# Altium integrated library LEMO Unipole And Multipole Type Connectors.IntLib: 1566 symbols (part 10 of 13) (continued)
## PKC.M1.0GL.VV
designator J?
Fixed receptacle with two nuts (back panel mounting), 90° print contacts, Key (C),  series, Multipole Type with 10 Contacts; Manufacturer: LEMO; PartNumber: PKC.M1.0GL.VV; Number of contacts: 10; Contact Diameter: 0.5 mm; Test voltage (kV rms) Contact-Contact: 0.85; Rated Current(A): 3; DatasheetVersion: Jun-14; PackageReference: PKC.M1.0GL.VV; PackageDescription: Fixed receptacle with two nuts (back panel mounting), 90° print contacts, Key(C) for Printed Circuit; ComponentLink1Description: Manufacturer URL; ComponentLink1URL: http://www.lemo.com; ComponentLink2Description: Datasheet; ComponentLink2URL: http://intra.lemo.ch/catalog/ROW/UK_English/P_series_catalog.pdf
footprint PKC.M1.0GL.VV (Socket, Female, Height 33.5 mm, Through hole)
pins: 1, 2, 3, 4, 5, 6, 7, 8, 9, 10

## PKC.M1.0GL.VZ
designator J?
Fixed receptacle with 1 nut (without 2nd front nut), Key (C), P series, Multipole Type with 10 Contacts; Manufacturer: LEMO; PartNumber: PKC.M1.0GL.VZ; Number of contacts: 10; Contact Diameter: 0.5 mm; Test voltage (kV rms) Contact-Contact: 0.85; Rated Current(A): 3; DatasheetVersion: Jun-14; PackageReference: PKC.M1.0GL.VZ; PackageDescription: Fixed receptacle with 1 nut (without 2nd front nut), Key(C) for Printed Circuit; ComponentLink1Description: Manufacturer URL; ComponentLink1URL: http://www.lemo.com; ComponentLink2Description: Datasheet; ComponentLink2URL: http://intra.lemo.ch/catalog/ROW/UK_English/P_series_catalog.pdf
footprint PKC.M1.0GL.VZ (Socket, Female, Height 33.5 mm, Through hole)
pins: 1, 2, 3, 4, 5, 6, 7, 8, 9, 10

## PKC.M1.0NL.NZ
designator J?
Fixed receptacle with 1 nut (without 2nd front nut), Key (C), P series, Multipole Type with 10 Contacts; Manufacturer: LEMO; PartNumber: PKC.M1.0NL.NZ; Number of contacts: 10; Contact Diameter: 0.5 mm; Test voltage (kV rms) Contact-Contact: 0.85; Rated Current(A): 3; DatasheetVersion: Jun-14; PackageReference: PKC.M1.0NL.NZ; PackageDescription: Fixed receptacle with 1 nut (without 2nd front nut), Key(C) for Printed Circuit; ComponentLink1Description: Manufacturer URL; ComponentLink1URL: http://www.lemo.com; ComponentLink2Description: Datasheet; ComponentLink2URL: http://intra.lemo.ch/catalog/ROW/UK_English/P_series_catalog.pdf
footprint PKC.M1.0NL.NZ (Socket, Female, Height 25 mm, Through hole)
pins: 1, 2, 3, 4, 5, 6, 7, 8, 9, 10

## PKC.M1.0NL.VN
designator J?
Fixed receptacle with two nuts (back panel mounting), 90° print contacts, Key (C), P series, Multipole Type with 10 Contacts; Manufacturer: LEMO; PartNumber: PKC.M1.0NL.VN; Number of contacts: 10; Contact Diameter: 0.5 mm; Test voltage (kV rms) Contact-Contact: 0.85; Rated Current(A): 3; DatasheetVersion: Jun-14; PackageReference: PKC.M1.0NL.VN; PackageDescription: Fixed receptacle with two nuts (back panel mounting), 90° print contacts, Key(C) for Printed Circuit; ComponentLink1Description: Manufacturer URL; ComponentLink1URL: http://www.lemo.com; ComponentLink2Description: Datasheet; ComponentLink2URL: http://intra.lemo.ch/catalog/ROW/UK_English/P_series_catalog.pdf
footprint PKC.M1.0NL.VN (Socket, Female, Height 33.5 mm, Through hole)
pins: 1, 2, 3, 4, 5, 6, 7, 8, 9, 10

## PKC.M1.0SL.NG
designator J?
Fixed receptacle with two nuts (back panel mounting), straight print contacts, Key (C), P series, Multipole Type with 10 Contacts; Manufacturer: LEMO; PartNumber: PKC.M1.0SL.NG; Number of contacts: 10; Contact Diameter: 0.5 mm; Test voltage (kV rms) Contact-Contact: 0.85; Rated Current(A): 3; DatasheetVersion: Jun-14; PackageReference: PKC.M1.0SL.NG; PackageDescription: Fixed receptacle with two nuts (back panel mounting), straight print contacts, Key(C) for Printed Circuit; Supplier 1: Mouser; Supplier Part Number 1: 736-PKC.M1.0SL.NG; Supplier 2: Digi-Key; Supplier Part Number 2: PKC.M1.0SL.NG-ND; ComponentLink1Description: Manufacturer URL; ComponentLink1URL: http://www.lemo.com; ComponentLink2Description: Datasheet; ComponentLink2URL: http://intra.lemo.ch/catalog/ROW/UK_English/P_series_catalog.pdf
footprint PKC.M1.0SL.NG (Socket, Female, Height 33.5 mm, Through hole)
pins: 1, 2, 3, 4, 5, 6, 7, 8, 9, 10

## PKC.M1.0SL.NJ
designator J?
Fixed receptacle with two nuts (back panel mounting), straight print contacts, Key (C), P series, Multipole Type with 10 Contacts; Manufacturer: LEMO; PartNumber: PKC.M1.0SL.NJ; Number of contacts: 10; Contact Diameter: 0.5 mm; Test voltage (kV rms) Contact-Contact: 0.85; Rated Current(A): 3; DatasheetVersion: Jun-14; PackageReference: PKC.M1.0SL.NJ; PackageDescription: Fixed receptacle with two nuts (back panel mounting), straight print contacts, Key(C) for Printed Circuit; Supplier 1: Mouser; Supplier Part Number 1: 736-PKCM10SLNJ; Supplier 2: Digi-Key; Supplier Part Number 2: PKC.M1.0SL.NJ-ND; ComponentLink1Description: Manufacturer URL; ComponentLink1URL: http://www.lemo.com; ComponentLink2Description: Datasheet; ComponentLink2URL: http://intra.lemo.ch/catalog/ROW/UK_English/P_series_catalog.pdf
footprint PKC.M1.0SL.NJ (Socket, Female, Height 33.5 mm, Through hole)
pins: 1, 2, 3, 4, 5, 6, 7, 8, 9, 10

## PKC.M1.0SL.VG
designator J?
Fixed receptacle with two nuts (back panel mounting), 90° print contacts, Key (C), P series, Multipole Type with 10 Contacts; Manufacturer: LEMO; PartNumber: PKC.M1.0SL.VG; Number of contacts: 10; Contact Diameter: 0.5 mm; Test voltage (kV rms) Contact-Contact: 0.85; Rated Current(A): 3; DatasheetVersion: Jun-14; PackageReference: PKC.M1.0SL.VG; PackageDescription: Fixed receptacle with two nuts (back panel mounting), 90° print contacts, Key(C) for Printed Circuit; Supplier 1: Mouser; Supplier Part Number 1: 736-PKCM10SLVG; Supplier 2: Digi-Key; Supplier Part Number 2: PKC.M1.0SL.VG-ND; ComponentLink1Description: Manufacturer URL; ComponentLink1URL: http://www.lemo.com; ComponentLink2Description: Datasheet; ComponentLink2URL: http://intra.lemo.ch/catalog/ROW/UK_English/P_series_catalog.pdf
footprint PKC.M1.0SL.VG (Socket, Female, Height 33.5 mm, Through hole)
pins: 1, 2, 3, 4, 5, 6, 7, 8, 9, 10

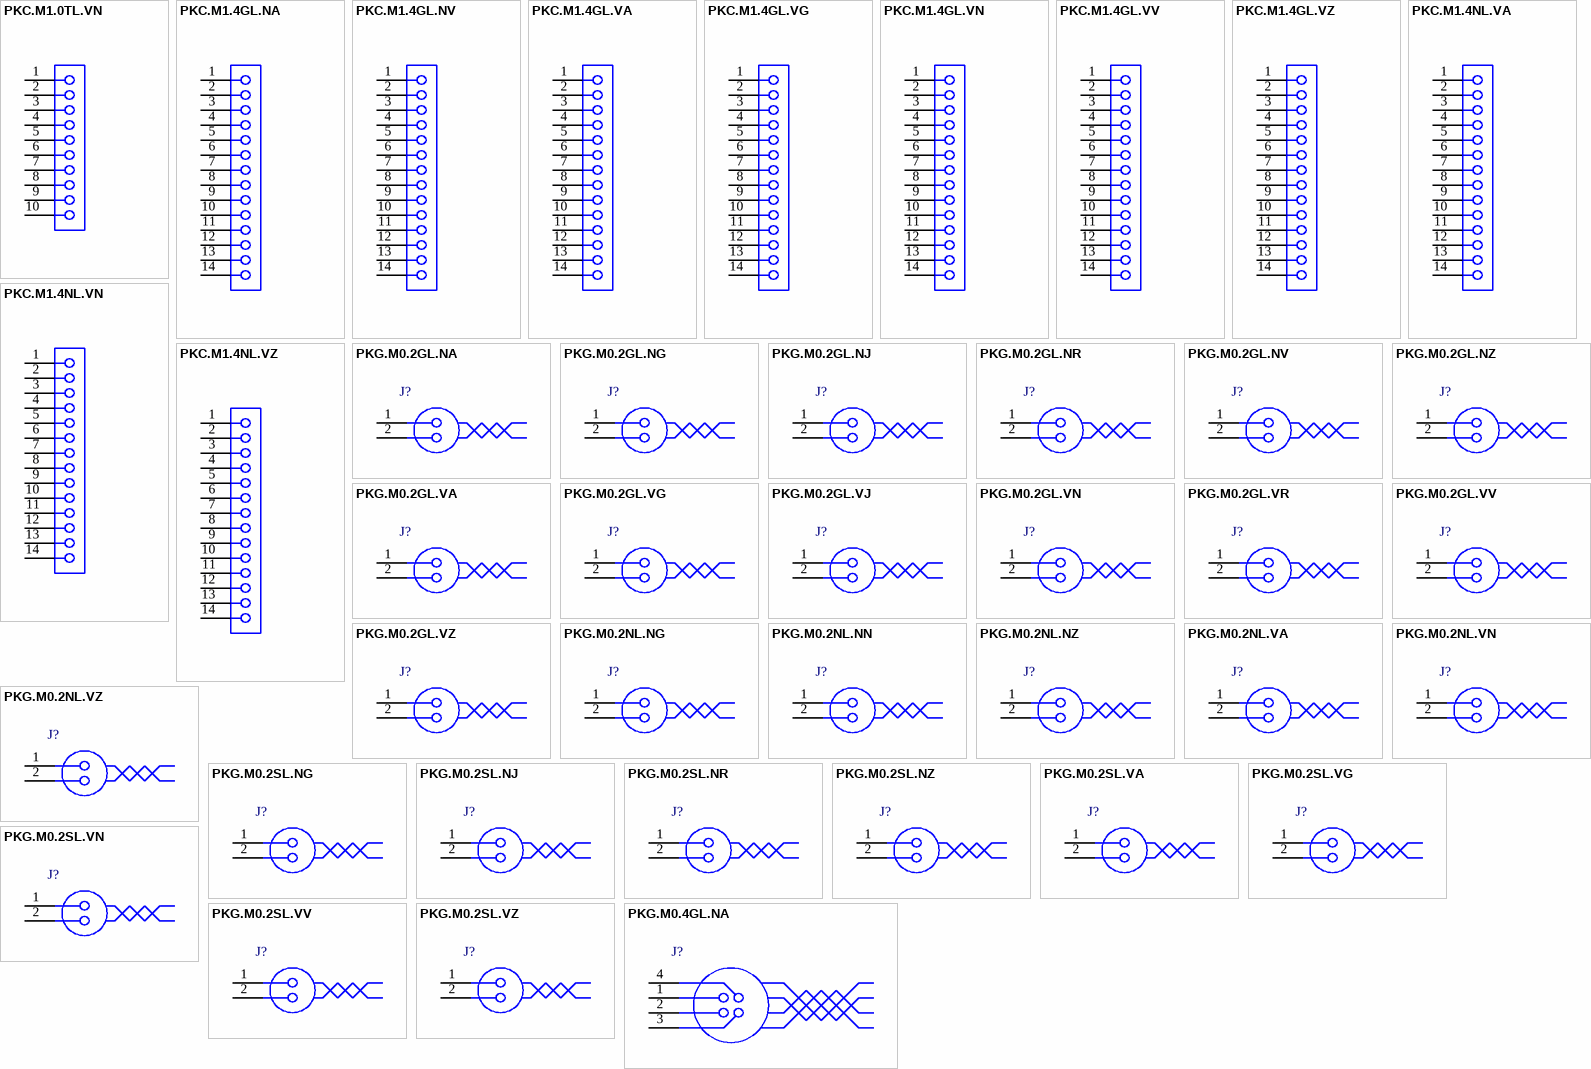
[diagram p33: symbols PKC.M1.0TL.VN to PKG.M0.4GL.NA]

## PKC.M1.0TL.VN
designator J?
Fixed receptacle with two nuts (back panel mounting), 90° print contacts, Key (C), P series, Multipole Type with 10 Contacts; Manufacturer: LEMO; PartNumber: PKC.M1.0TL.VN; Number of contacts: 10; Contact Diameter: 0.5 mm; Test voltage (kV rms) Contact-Contact: 0.85; Rated Current(A): 3; DatasheetVersion: Jun-14; PackageReference: PKC.M1.0TL.VN; PackageDescription: Fixed receptacle with two nuts (back panel mounting), 90° print contacts, Key(C) for Printed Circuit; ComponentLink1Description: Manufacturer URL; ComponentLink1URL: http://www.lemo.com; ComponentLink2Description: Datasheet; ComponentLink2URL: http://intra.lemo.ch/catalog/ROW/UK_English/P_series_catalog.pdf
footprint PKC.M1.0TL.VN (Socket, Female, Height 33.5 mm, Through hole)
pins: 1, 2, 3, 4, 5, 6, 7, 8, 9, 10

## PKC.M1.4GL.NA
designator J?
Fixed receptacle with two nuts (back panel mounting), straight print contacts, Key (C), P series, Multipole Type with 14 Contacts; Manufacturer: LEMO; PartNumber: PKC.M1.4GL.NA; Number of contacts: 14; Contact Diameter: 0.5 mm; Test voltage (kV rms) Contact-Contact: 0.6; Rated Current(A): 2; DatasheetVersion: Jun-14; PackageReference: PKC.M1.4GL.NA; PackageDescription: Fixed receptacle with two nuts (back panel mounting), straight print contacts, Key(C) for Printed Circuit; ComponentLink1Description: Manufacturer URL; ComponentLink1URL: http://www.lemo.com; ComponentLink2Description: Datasheet; ComponentLink2URL: http://intra.lemo.ch/catalog/ROW/UK_English/P_series_catalog.pdf
footprint PKC.M1.4GL.NA (Socket, Female, Height 33.5 mm, Through hole)
pins: 1, 2, 3, 4, 5, 6, 7, 8, 9, 10, 11, 12, 13, 14

## PKC.M1.4GL.NV
designator J?
Fixed receptacle with two nuts (back panel mounting), straight print contacts, Key (C), P series, Multipole Type with 14 Contacts; Manufacturer: LEMO; PartNumber: PKC.M1.4GL.NV; Number of contacts: 14; Contact Diameter: 0.5 mm; Test voltage (kV rms) Contact-Contact: 0.6; Rated Current(A): 2; DatasheetVersion: Jun-14; PackageReference: PKC.M1.4GL.NV; PackageDescription: Fixed receptacle with two nuts (back panel mounting), straight print contacts, Key(C) for Printed Circuit; ComponentLink1Description: Manufacturer URL; ComponentLink1URL: http://www.lemo.com; ComponentLink2Description: Datasheet; ComponentLink2URL: http://intra.lemo.ch/catalog/ROW/UK_English/P_series_catalog.pdf
footprint PKC.M1.4GL.NV (Socket, Female, Height 33.5 mm, Through hole)
pins: 1, 2, 3, 4, 5, 6, 7, 8, 9, 10, 11, 12, 13, 14

## PKC.M1.4GL.VA
designator J?
Fixed receptacle with two nuts (back panel mounting), 90° print contacts, Key (C), P series, Multipole Type with 14 Contacts; Manufacturer: LEMO; PartNumber: PKC.M1.4GL.VA; Number of contacts: 14; Contact Diameter: 0.5 mm; Test voltage (kV rms) Contact-Contact: 0.6; Rated Current(A): 2; DatasheetVersion: Jun-14; PackageReference: PKC.M1.4GL.VA; PackageDescription: Fixed receptacle with two nuts (back panel mounting), 90° print contacts, Key(C) for Printed Circuit; ComponentLink1Description: Manufacturer URL; ComponentLink1URL: http://www.lemo.com; ComponentLink2Description: Datasheet; ComponentLink2URL: http://intra.lemo.ch/catalog/ROW/UK_English/P_series_catalog.pdf
footprint PKC.M1.4GL.VA (Socket, Female, Height 33.5 mm, Through hole)
pins: 1, 2, 3, 4, 5, 6, 7, 8, 9, 10, 11, 12, 13, 14

## PKC.M1.4GL.VG
designator J?
Fixed receptacle with two nuts (back panel mounting), 90° print contacts, Key (C),  series, Multipole Type with 14 Contacts; Manufacturer: LEMO; PartNumber: PKC.M1.4GL.VG; Number of contacts: 14; Contact Diameter: 0.5 mm; Test voltage (kV rms) Contact-Contact: 0.6; Rated Current(A): 2; DatasheetVersion: Jun-14; PackageReference: PKC.M1.4GL.VG; PackageDescription: Fixed receptacle with two nuts (back panel mounting), 90° print contacts, Key(C) for Printed Circuit; ComponentLink1Description: Manufacturer URL; ComponentLink1URL: http://www.lemo.com; ComponentLink2Description: Datasheet; ComponentLink2URL: http://intra.lemo.ch/catalog/ROW/UK_English/P_series_catalog.pdf
footprint PKC.M1.4GL.VG (Socket, Female, Height 33.5 mm, Through hole)
pins: 1, 2, 3, 4, 5, 6, 7, 8, 9, 10, 11, 12, 13, 14

## PKC.M1.4GL.VN
designator J?
Fixed receptacle with two nuts (back panel mounting), 90° print contacts, Key (C), P series, Multipole Type with 14 Contacts; Manufacturer: LEMO; PartNumber: PKC.M1.4GL.VN; Number of contacts: 14; Contact Diameter: 0.5 mm; Test voltage (kV rms) Contact-Contact: 0.6; Rated Current(A): 2; DatasheetVersion: Jun-14; PackageReference: PKC.M1.4GL.VN; PackageDescription: Fixed receptacle with two nuts (back panel mounting), 90° print contacts, Key(C) for Printed Circuit; ComponentLink1Description: Manufacturer URL; ComponentLink1URL: http://www.lemo.com; ComponentLink2Description: Datasheet; ComponentLink2URL: http://intra.lemo.ch/catalog/ROW/UK_English/P_series_catalog.pdf
footprint PKC.M1.4GL.VN (Socket, Female, Height 33.5 mm, Through hole)
pins: 1, 2, 3, 4, 5, 6, 7, 8, 9, 10, 11, 12, 13, 14

## PKC.M1.4GL.VV
designator J?
Fixed receptacle with two nuts (back panel mounting), 90° print contacts, Key (C), P series, Multipole Type with 14 Contacts; Manufacturer: LEMO; PartNumber: PKC.M1.4GL.VV; Number of contacts: 14; Contact Diameter: 0.5 mm; Test voltage (kV rms) Contact-Contact: 0.6; Rated Current(A): 2; DatasheetVersion: Jun-14; PackageReference: PKC.M1.4GL.VV; PackageDescription: Fixed receptacle with two nuts (back panel mounting), 90° print contacts, Key(C) for Printed Circuit; ComponentLink1Description: Manufacturer URL; ComponentLink1URL: http://www.lemo.com; ComponentLink2Description: Datasheet; ComponentLink2URL: http://intra.lemo.ch/catalog/ROW/UK_English/P_series_catalog.pdf
footprint PKC.M1.4GL.VV (Socket, Female, Height 33.5 mm, Through hole)
pins: 1, 2, 3, 4, 5, 6, 7, 8, 9, 10, 11, 12, 13, 14

## PKC.M1.4GL.VZ
designator J?
Fixed receptacle with 1 nut (without 2nd front nut), Key (C), P series, Multipole Type with 14 Contacts; Manufacturer: LEMO; PartNumber: PKC.M1.4GL.VZ; Number of contacts: 14; Contact Diameter: 0.5 mm; Test voltage (kV rms) Contact-Contact: 0.6; Rated Current(A): 2; DatasheetVersion: Jun-14; PackageReference: PKC.M1.4GL.VZ; PackageDescription: Fixed receptacle with 1 nut (without 2nd front nut), Key(C) for Printed Circuit; ComponentLink1Description: Manufacturer URL; ComponentLink1URL: http://www.lemo.com; ComponentLink2Description: Datasheet; ComponentLink2URL: http://intra.lemo.ch/catalog/ROW/UK_English/P_series_catalog.pdf
footprint PKC.M1.4GL.VZ (Socket, Female, Height 33.5 mm, Through hole)
pins: 1, 2, 3, 4, 5, 6, 7, 8, 9, 10, 11, 12, 13, 14

## PKC.M1.4NL.VA
designator J?
Fixed receptacle with two nuts (back panel mounting), 90° print contacts, Key (C),  series, Multipole Type with 14 Contacts; Manufacturer: LEMO; PartNumber: PKC.M1.4NL.VA; Number of contacts: 14; Contact Diameter: 0.5 mm; Test voltage (kV rms) Contact-Contact: 0.6; Rated Current(A): 2; DatasheetVersion: Jun-14; PackageReference: PKC.M1.4NL.VA; PackageDescription: Fixed receptacle with two nuts (back panel mounting), 90° print contacts, Key(C) for Printed Circuit; ComponentLink1Description: Manufacturer URL; ComponentLink1URL: http://www.lemo.com; ComponentLink2Description: Datasheet; ComponentLink2URL: http://intra.lemo.ch/catalog/ROW/UK_English/P_series_catalog.pdf
footprint PKC.M1.4NL.VA (Socket, Female, Height 33.5 mm, Through hole)
pins: 1, 2, 3, 4, 5, 6, 7, 8, 9, 10, 11, 12, 13, 14

## PKC.M1.4NL.VN
designator J?
Fixed receptacle with two nuts (back panel mounting), 90° print contacts, Key (C), P series, Multipole Type with 14 Contacts; Manufacturer: LEMO; PartNumber: PKC.M1.4NL.VN; Number of contacts: 14; Contact Diameter: 0.5 mm; Test voltage (kV rms) Contact-Contact: 0.6; Rated Current(A): 2; DatasheetVersion: Jun-14; PackageReference: PKC.M1.4NL.VN; PackageDescription: Fixed receptacle with two nuts (back panel mounting), 90° print contacts, Key(C) for Printed Circuit; ComponentLink1Description: Manufacturer URL; ComponentLink1URL: http://www.lemo.com; ComponentLink2Description: Datasheet; ComponentLink2URL: http://intra.lemo.ch/catalog/ROW/UK_English/P_series_catalog.pdf
footprint PKC.M1.4NL.VN (Socket, Female, Height 33.5 mm, Through hole)
pins: 1, 2, 3, 4, 5, 6, 7, 8, 9, 10, 11, 12, 13, 14

## PKC.M1.4NL.VZ
designator J?
Fixed receptacle with 1 nut (without 2nd front nut), Key (C), P series, Multipole Type with 14 Contacts; Manufacturer: LEMO; PartNumber: PKC.M1.4NL.VZ; Number of contacts: 14; Contact Diameter: 0.5 mm; Test voltage (kV rms) Contact-Contact: 0.6; Rated Current(A): 2; DatasheetVersion: Jun-14; PackageReference: PKC.M1.4NL.VZ; PackageDescription: Fixed receptacle with 1 nut (without 2nd front nut), Key(C) for Printed Circuit; ComponentLink1Description: Manufacturer URL; ComponentLink1URL: http://www.lemo.com; ComponentLink2Description: Datasheet; ComponentLink2URL: http://intra.lemo.ch/catalog/ROW/UK_English/P_series_catalog.pdf
footprint PKC.M1.4NL.VZ (Socket, Female, Height 33.5 mm, Through hole)
pins: 1, 2, 3, 4, 5, 6, 7, 8, 9, 10, 11, 12, 13, 14

## PKG.M0.2GL.NA
designator J?
Fixed receptacle with two nuts (back panel mounting), straight print contacts, Key (G), P series, Multipole Type with 2 Contacts; Manufacturer: LEMO; PartNumber: PKG.M0.2GL.NA; Number of contacts: 2; Contact Diameter: 1.3 mm; Test voltage (kV rms) Contact-Contact: 1.2; Rated Current(A): 10; DatasheetVersion: Jun-14; PackageReference: PKG.M0.2GL.NA; PackageDescription: Fixed receptacle with two nuts (back panel mounting), straight print contacts, Key(G) for Printed Circuit; ComponentLink1Description: Manufacturer URL; ComponentLink1URL: http://www.lemo.com; ComponentLink2Description: Datasheet; ComponentLink2URL: http://intra.lemo.ch/catalog/ROW/UK_English/P_series_catalog.pdf
footprint PKG.M0.2GL.NA (Socket, Female, Height 33.5 mm, Through hole)
pins: 1, 2

## PKG.M0.2GL.NG
designator J?
Fixed receptacle with two nuts (back panel mounting), straight print contacts, Key (G), P series, Multipole Type with 2 Contacts; Manufacturer: LEMO; PartNumber: PKG.M0.2GL.NG; Number of contacts: 2; Contact Diameter: 1.3 mm; Test voltage (kV rms) Contact-Contact: 1.2; Rated Current(A): 10; DatasheetVersion: Jun-14; PackageReference: PKG.M0.2GL.NG; PackageDescription: Fixed receptacle with two nuts (back panel mounting), straight print contacts, Key(G) for Printed Circuit; ComponentLink1Description: Manufacturer URL; ComponentLink1URL: http://www.lemo.com; ComponentLink2Description: Datasheet; ComponentLink2URL: http://intra.lemo.ch/catalog/ROW/UK_English/P_series_catalog.pdf
footprint PKG.M0.2GL.NG (Socket, Female, Height 33.5 mm, Through hole)
pins: 1, 2

## PKG.M0.2GL.NJ
designator J?
Fixed receptacle with two nuts (back panel mounting), straight print contacts, Key (G), P series, Multipole Type with 2 Contacts; Manufacturer: LEMO; PartNumber: PKG.M0.2GL.NJ; Number of contacts: 2; Contact Diameter: 1.3 mm; Test voltage (kV rms) Contact-Contact: 1.2; Rated Current(A): 10; DatasheetVersion: Jun-14; PackageReference: PKG.M0.2GL.NJ; PackageDescription: Fixed receptacle with two nuts (back panel mounting), straight print contacts, Key(G) for Printed Circuit; ComponentLink1Description: Manufacturer URL; ComponentLink1URL: http://www.lemo.com; ComponentLink2Description: Datasheet; ComponentLink2URL: http://intra.lemo.ch/catalog/ROW/UK_English/P_series_catalog.pdf
footprint PKG.M0.2GL.NJ (Socket, Female, Height 33.5 mm, Through hole)
pins: 1, 2

## PKG.M0.2GL.NR
designator J?
Fixed receptacle with two nuts (back panel mounting), straight print contacts, Key (G), P series, Multipole Type with 2 Contacts; Manufacturer: LEMO; PartNumber: PKG.M0.2GL.NR; Number of contacts: 2; Contact Diameter: 1.3 mm; Test voltage (kV rms) Contact-Contact: 1.2; Rated Current(A): 10; DatasheetVersion: Jun-14; PackageReference: PKG.M0.2GL.NR; PackageDescription: Fixed receptacle with two nuts (back panel mounting), straight print contacts, Key(G) for Printed Circuit; ComponentLink1Description: Manufacturer URL; ComponentLink1URL: http://www.lemo.com; ComponentLink2Description: Datasheet; ComponentLink2URL: http://intra.lemo.ch/catalog/ROW/UK_English/P_series_catalog.pdf
footprint PKG.M0.2GL.NR (Socket, Female, Height 33.5 mm, Through hole)
pins: 1, 2

## PKG.M0.2GL.NV
designator J?
Fixed receptacle with two nuts (back panel mounting), straight print contacts, Key (G), P series, Multipole Type with 2 Contacts; Manufacturer: LEMO; PartNumber: PKG.M0.2GL.NV; Number of contacts: 2; Contact Diameter: 1.3 mm; Test voltage (kV rms) Contact-Contact: 1.2; Rated Current(A): 10; DatasheetVersion: Jun-14; PackageReference: PKG.M0.2GL.NV; PackageDescription: Fixed receptacle with two nuts (back panel mounting), straight print contacts, Key(G) for Printed Circuit; ComponentLink1Description: Manufacturer URL; ComponentLink1URL: http://www.lemo.com; ComponentLink2Description: Datasheet; ComponentLink2URL: http://intra.lemo.ch/catalog/ROW/UK_English/P_series_catalog.pdf
footprint PKG.M0.2GL.NV (Socket, Female, Height 33.5 mm, Through hole)
pins: 1, 2

## PKG.M0.2GL.NZ
designator J?
Fixed receptacle with 1 nut (without 2nd front nut), Key (G), P series, Multipole Type with 2 Contacts; Manufacturer: LEMO; PartNumber: PKG.M0.2GL.NZ; Number of contacts: 2; Contact Diameter: 1.3 mm; Test voltage (kV rms) Contact-Contact: 1.2; Rated Current(A): 10; DatasheetVersion: Jun-14; PackageReference: PKG.M0.2GL.NZ; PackageDescription: Fixed receptacle with 1 nut (without 2nd front nut), Key(G) for Printed Circuit; ComponentLink1Description: Manufacturer URL; ComponentLink1URL: http://www.lemo.com; ComponentLink2Description: Datasheet; ComponentLink2URL: http://intra.lemo.ch/catalog/ROW/UK_English/P_series_catalog.pdf
footprint PKG.M0.2GL.NZ (Socket, Female, Height 25 mm, Through hole)
pins: 1, 2

## PKG.M0.2GL.VA
designator J?
Fixed receptacle with two nuts (back panel mounting), 90° print contacts, Key (G), P series, Multipole Type with 2 Contacts; Manufacturer: LEMO; PartNumber: PKG.M0.2GL.VA; Number of contacts: 2; Contact Diameter: 1.3 mm; Test voltage (kV rms) Contact-Contact: 1.2; Rated Current(A): 10; DatasheetVersion: Jun-14; PackageReference: PKG.M0.2GL.VA; PackageDescription: Fixed receptacle with two nuts (back panel mounting), 90° print contacts, Key(G) for Printed Circuit; ComponentLink1Description: Manufacturer URL; ComponentLink1URL: http://www.lemo.com; ComponentLink2Description: Datasheet; ComponentLink2URL: http://intra.lemo.ch/catalog/ROW/UK_English/P_series_catalog.pdf
footprint PKG.M0.2GL.VA (Socket, Female, Height 33.5 mm, Through hole)
pins: 1, 2

## PKG.M0.2GL.VG
designator J?
Fixed receptacle with two nuts (back panel mounting), 90° print contacts, Key (G), P series, Multipole Type with 2 Contacts; Manufacturer: LEMO; PartNumber: PKG.M0.2GL.VG; Number of contacts: 2; Contact Diameter: 1.3 mm; Test voltage (kV rms) Contact-Contact: 1.2; Rated Current(A): 10; DatasheetVersion: Jun-14; PackageReference: PKG.M0.2GL.VG; PackageDescription: Fixed receptacle with two nuts (back panel mounting), 90° print contacts, Key(G) for Printed Circuit; ComponentLink1Description: Manufacturer URL; ComponentLink1URL: http://www.lemo.com; ComponentLink2Description: Datasheet; ComponentLink2URL: http://intra.lemo.ch/catalog/ROW/UK_English/P_series_catalog.pdf
footprint PKG.M0.2GL.VG (Socket, Female, Height 33.5 mm, Through hole)
pins: 1, 2

## PKG.M0.2GL.VJ
designator J?
Fixed receptacle with two nuts (back panel mounting), 90° print contacts, Key (G), P series, Multipole Type with 2 Contacts; Manufacturer: LEMO; PartNumber: PKG.M0.2GL.VJ; Number of contacts: 2; Contact Diameter: 1.3 mm; Test voltage (kV rms) Contact-Contact: 1.2; Rated Current(A): 10; DatasheetVersion: Jun-14; PackageReference: PKG.M0.2GL.VJ; PackageDescription: Fixed receptacle with two nuts (back panel mounting), 90° print contacts, Key(G) for Printed Circuit; ComponentLink1Description: Manufacturer URL; ComponentLink1URL: http://www.lemo.com; ComponentLink2Description: Datasheet; ComponentLink2URL: http://intra.lemo.ch/catalog/ROW/UK_English/P_series_catalog.pdf
footprint PKG.M0.2GL.VJ (Socket, Female, Height 33.5 mm, Through hole)
pins: 1, 2

## PKG.M0.2GL.VN
designator J?
Fixed receptacle with two nuts (back panel mounting), 90° print contacts, Key (G), P series, Multipole Type with 2 Contacts; Manufacturer: LEMO; PartNumber: PKG.M0.2GL.VN; Number of contacts: 2; Contact Diameter: 1.3 mm; Test voltage (kV rms) Contact-Contact: 1.2; Rated Current(A): 10; DatasheetVersion: Jun-14; PackageReference: PKG.M0.2GL.VN; PackageDescription: Fixed receptacle with two nuts (back panel mounting), 90° print contacts, Key(G) for Printed Circuit; ComponentLink1Description: Manufacturer URL; ComponentLink1URL: http://www.lemo.com; ComponentLink2Description: Datasheet; ComponentLink2URL: http://intra.lemo.ch/catalog/ROW/UK_English/P_series_catalog.pdf
footprint PKG.M0.2GL.VN (Socket, Female, Height 33.5 mm, Through hole)
pins: 1, 2

## PKG.M0.2GL.VR
designator J?
Fixed receptacle with two nuts (back panel mounting), 90° print contacts, Key (G), P series, Multipole Type with 2 Contacts; Manufacturer: LEMO; PartNumber: PKG.M0.2GL.VR; Number of contacts: 2; Contact Diameter: 1.3 mm; Test voltage (kV rms) Contact-Contact: 1.2; Rated Current(A): 10; DatasheetVersion: Jun-14; PackageReference: PKG.M0.2GL.VR; PackageDescription: Fixed receptacle with two nuts (back panel mounting), 90° print contacts, Key(G) for Printed Circuit; ComponentLink1Description: Manufacturer URL; ComponentLink1URL: http://www.lemo.com; ComponentLink2Description: Datasheet; ComponentLink2URL: http://intra.lemo.ch/catalog/ROW/UK_English/P_series_catalog.pdf
footprint PKG.M0.2GL.VR (Socket, Female, Height 33.5 mm, Through hole)
pins: 1, 2

## PKG.M0.2GL.VV
designator J?
Fixed receptacle with two nuts (back panel mounting), 90° print contacts, Key (G), P series, Multipole Type with 2 Contacts; Manufacturer: LEMO; PartNumber: PKG.M0.2GL.VV; Number of contacts: 2; Contact Diameter: 1.3 mm; Test voltage (kV rms) Contact-Contact: 1.2; Rated Current(A): 10; DatasheetVersion: Jun-14; PackageReference: PKG.M0.2GL.VV; PackageDescription: Fixed receptacle with two nuts (back panel mounting), 90° print contacts, Key(G) for Printed Circuit; ComponentLink1Description: Manufacturer URL; ComponentLink1URL: http://www.lemo.com; ComponentLink2Description: Datasheet; ComponentLink2URL: http://intra.lemo.ch/catalog/ROW/UK_English/P_series_catalog.pdf
footprint PKG.M0.2GL.VV (Socket, Female, Height 33.5 mm, Through hole)
pins: 1, 2

## PKG.M0.2GL.VZ
designator J?
Fixed receptacle with 1 nut (without 2nd front nut), Key (G), P series, Multipole Type with 2 Contacts; Manufacturer: LEMO; PartNumber: PKG.M0.2GL.VZ; Number of contacts: 2; Contact Diameter: 1.3 mm; Test voltage (kV rms) Contact-Contact: 1.2; Rated Current(A): 10; DatasheetVersion: Jun-14; PackageReference: PKG.M0.2GL.VZ; PackageDescription: Fixed receptacle with 1 nut (without 2nd front nut), Key(G) for Printed Circuit; ComponentLink1Description: Manufacturer URL; ComponentLink1URL: http://www.lemo.com; ComponentLink2Description: Datasheet; ComponentLink2URL: http://intra.lemo.ch/catalog/ROW/UK_English/P_series_catalog.pdf
footprint PKG.M0.2GL.VZ (Socket, Female, Height 33.5 mm, Through hole)
pins: 1, 2

## PKG.M0.2NL.NG
designator J?
Fixed receptacle with two nuts (back panel mounting), straight print contacts, Key (G), P series, Multipole Type with 2 Contacts; Manufacturer: LEMO; PartNumber: PKG.M0.2NL.NG; Number of contacts: 2; Contact Diameter: 1.3 mm; Test voltage (kV rms) Contact-Contact: 1.2; Rated Current(A): 10; DatasheetVersion: Jun-14; PackageReference: PKG.M0.2NL.NG; PackageDescription: Fixed receptacle with two nuts (back panel mounting), straight print contacts, Key(G) for Printed Circuit; ComponentLink1Description: Manufacturer URL; ComponentLink1URL: http://www.lemo.com; ComponentLink2Description: Datasheet; ComponentLink2URL: http://intra.lemo.ch/catalog/ROW/UK_English/P_series_catalog.pdf
footprint PKG.M0.2NL.NG (Socket, Female, Height 33.5 mm, Through hole)
pins: 1, 2

## PKG.M0.2NL.NN
designator J?
Fixed receptacle with two nuts (back panel mounting), straight print contacts, Key (G), P series, Multipole Type with 2 Contacts; Manufacturer: LEMO; PartNumber: PKG.M0.2NL.NN; Number of contacts: 2; Contact Diameter: 1.3 mm; Test voltage (kV rms) Contact-Contact: 1.2; Rated Current(A): 10; DatasheetVersion: Jun-14; PackageReference: PKG.M0.2NL.NN; PackageDescription: Fixed receptacle with two nuts (back panel mounting), straight print contacts, Key(G) for Printed Circuit; ComponentLink1Description: Manufacturer URL; ComponentLink1URL: http://www.lemo.com; ComponentLink2Description: Datasheet; ComponentLink2URL: http://intra.lemo.ch/catalog/ROW/UK_English/P_series_catalog.pdf
footprint PKG.M0.2NL.NN (Socket, Female, Height 33.5 mm, Through hole)
pins: 1, 2

## PKG.M0.2NL.NZ
designator J?
Fixed receptacle with 1 nut (without 2nd front nut), Key (G), P series, Multipole Type with 2 Contacts; Manufacturer: LEMO; PartNumber: PKG.M0.2NL.NZ; Number of contacts: 2; Contact Diameter: 1.3 mm; Test voltage (kV rms) Contact-Contact: 1.2; Rated Current(A): 10; DatasheetVersion: Jun-14; PackageReference: PKG.M0.2NL.NZ; PackageDescription: Fixed receptacle with 1 nut (without 2nd front nut), Key(G) for Printed Circuit; ComponentLink1Description: Manufacturer URL; ComponentLink1URL: http://www.lemo.com; ComponentLink2Description: Datasheet; ComponentLink2URL: http://intra.lemo.ch/catalog/ROW/UK_English/P_series_catalog.pdf
footprint PKG.M0.2NL.NZ (Socket, Female, Height 25 mm, Through hole)
pins: 1, 2

## PKG.M0.2NL.VA
designator J?
Fixed receptacle with two nuts (back panel mounting), 90° print contacts, Key (G), P series, Multipole Type with 2 Contacts; Manufacturer: LEMO; PartNumber: PKG.M0.2NL.VA; Number of contacts: 2; Contact Diameter: 1.3 mm; Test voltage (kV rms) Contact-Contact: 1.2; Rated Current(A): 10; DatasheetVersion: Jun-14; PackageReference: PKG.M0.2NL.VA; PackageDescription: Fixed receptacle with two nuts (back panel mounting), 90° print contacts, Key(G) for Printed Circuit; ComponentLink1Description: Manufacturer URL; ComponentLink1URL: http://www.lemo.com; ComponentLink2Description: Datasheet; ComponentLink2URL: http://intra.lemo.ch/catalog/ROW/UK_English/P_series_catalog.pdf
footprint PKG.M0.2NL.VA (Socket, Female, Height 33.5 mm, Through hole)
pins: 1, 2

## PKG.M0.2NL.VN
designator J?
Fixed receptacle with two nuts (back panel mounting), 90° print contacts, Key (G), P series, Multipole Type with 2 Contacts; Manufacturer: LEMO; PartNumber: PKG.M0.2NL.VN; Number of contacts: 2; Contact Diameter: 1.3 mm; Test voltage (kV rms) Contact-Contact: 1.2; Rated Current(A): 10; DatasheetVersion: Jun-14; PackageReference: PKG.M0.2NL.VN; PackageDescription: Fixed receptacle with two nuts (back panel mounting), 90° print contacts, Key(G) for Printed Circuit; ComponentLink1Description: Manufacturer URL; ComponentLink1URL: http://www.lemo.com; ComponentLink2Description: Datasheet; ComponentLink2URL: http://intra.lemo.ch/catalog/ROW/UK_English/P_series_catalog.pdf
footprint PKG.M0.2NL.VN (Socket, Female, Height 33.5 mm, Through hole)
pins: 1, 2